# Altium footprint library texas.PCBLIB: 124 footprints (part 2 of 12)
Each footprint in its own frame and in the unit in brackets; x right, y up, seen from the top. Pads: shape width x height; smd on the part's side, far side on the other; paste and mask are expansions set on the pad; w line width, h text height; cw(c..) or ccw(c..) is an arc to the next point about the centre after c.
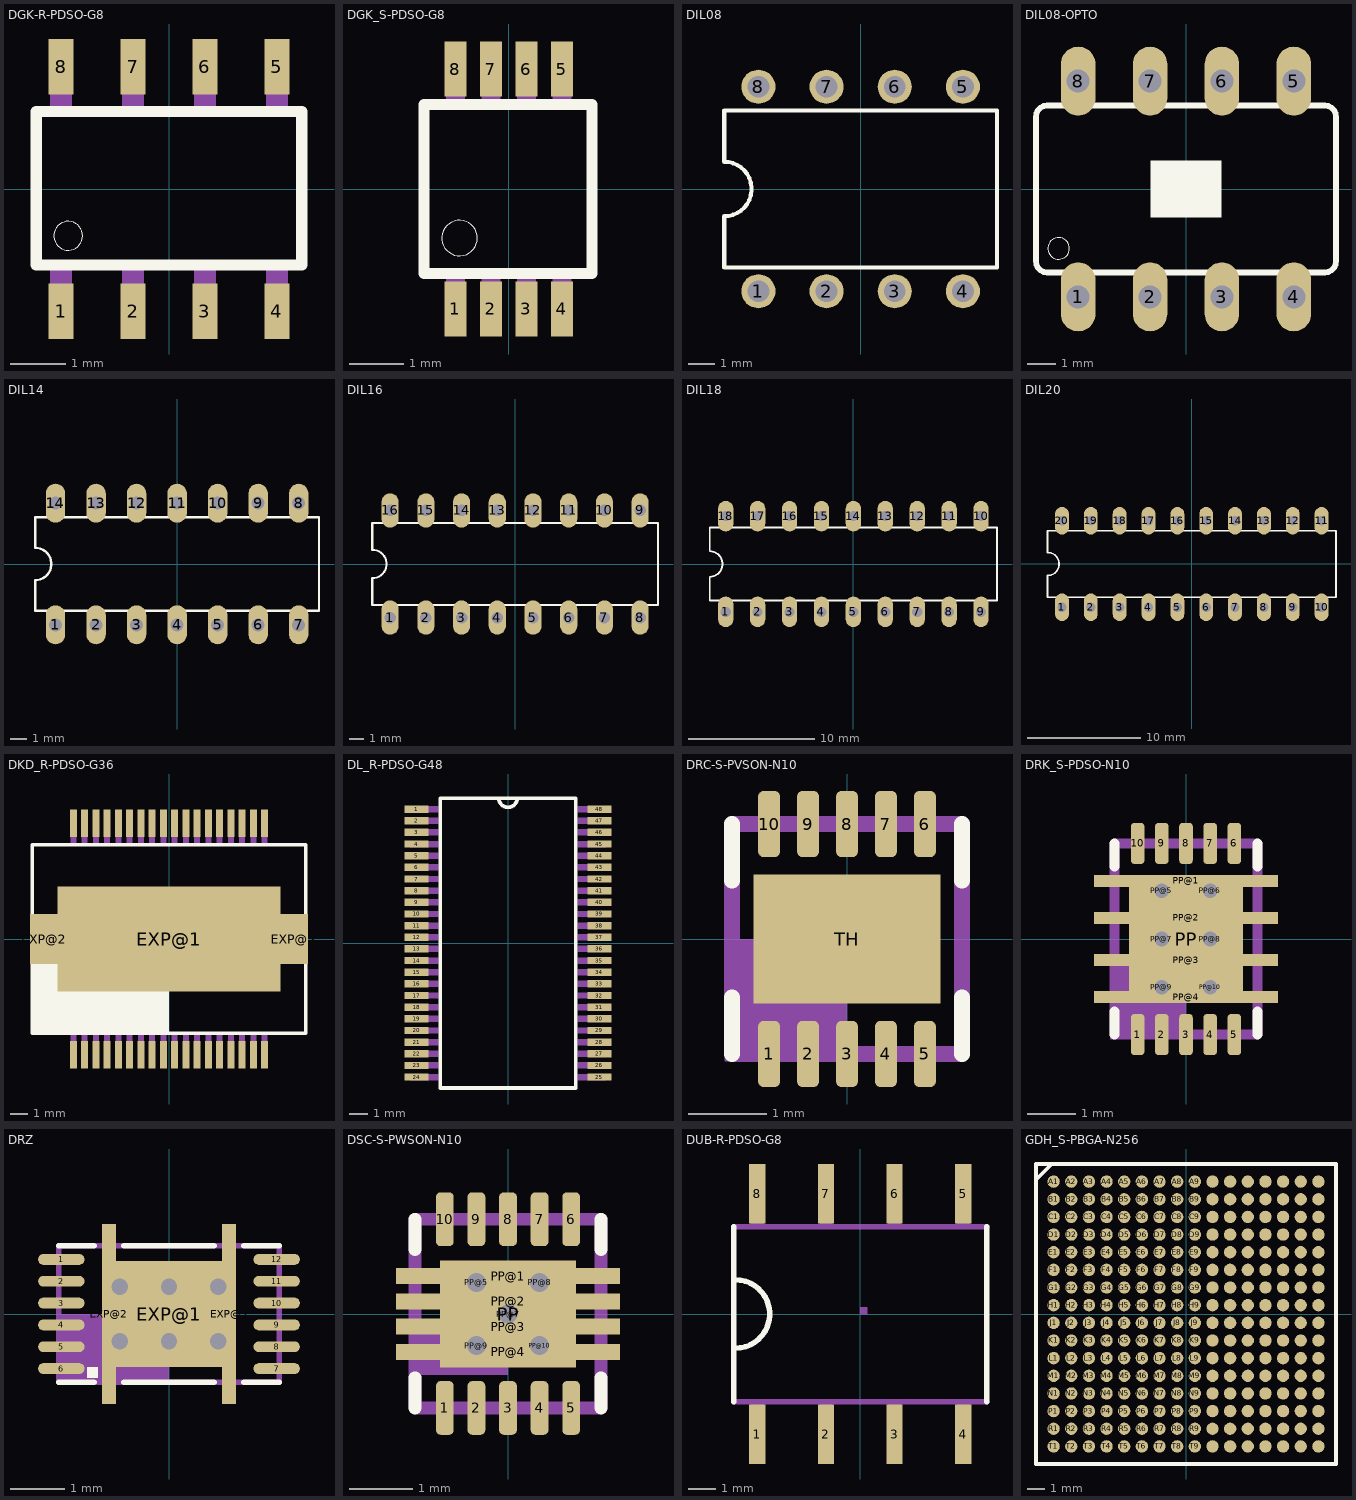
[diagram p1: the footprints below, top view; thin cyan lines are the x and y axes]

## DGK-R-PDSO-G8 [mm]
pads (8):
  rect 0.45x1 smd: 1(-1.95,-2.21) 2(-0.65,-2.21) 3(0.65,-2.21) 4(1.95,-2.21) 5(1.95,2.21) 6(0.65,2.21) 7(-0.65,2.21) 8(-1.95,2.21)
Top Overlay:
  circle w0: c-1.82,-0.845 r0.26
  lines w0.203: 2.4,1.375 2.4,-1.375 -2.4,-1.375 -2.4,1.4 2.4,1.4
Mechanical 16:
  rectangle: -2.15,-2.55 -1.75,-1.43
  rectangle: -0.85,-2.55 -0.45,-1.43
  rectangle: 0.45,-2.55 0.85,-1.43
  rectangle: 1.75,-2.55 2.15,-1.43
  region: 2.15,2.55 1.75,2.55 1.75,1.43 2.15,1.43
  region: 0.85,2.55 0.45,2.55 0.45,1.43 0.85,1.43
  region: -0.45,2.55 -0.85,2.55 -0.85,1.43 -0.45,1.43
  region: -1.75,2.55 -2.15,2.55 -2.15,1.43 -1.75,1.43

## DGK_S-PDSO-G8 [mm]
pads (8):
  rect 0.4x1 smd: 1(-0.975,-2.2) 2(-0.325,-2.2) 3(0.325,-2.2) 4(0.975,-2.2) 5(0.975,2.2) 6(0.325,2.2) 7(-0.325,2.2) 8(-0.975,2.2)
Top Overlay:
  circle w0: c-0.9,-0.9 r0.325
  lines w0.203: -1.55,-1.55 1.525,-1.55 1.525,1.55 -1.55,1.55 -1.55,-1.55
Top Solder:
  rectangle: -1.2,-2.75 -0.75,-1.65
  rectangle: -0.55,-2.75 -0.1,-1.65
  rectangle: 0.1,-2.75 0.55,-1.65
  rectangle: 0.75,-2.75 1.2,-1.65
  region: 1.2,2.75 0.75,2.75 0.75,1.65 1.2,1.65
  region: 0.55,2.75 0.1,2.75 0.1,1.65 0.55,1.65
  region: -0.1,2.75 -0.55,2.75 -0.55,1.65 -0.1,1.65
  region: -0.75,2.75 -1.2,2.75 -1.2,1.65 -0.75,1.65
Mechanical 16:
  rectangle: -1.15,-2.5 -0.8,-1.625
  rectangle: -0.5,-2.5 -0.15,-1.625
  rectangle: 0.15,-2.5 0.5,-1.625
  rectangle: 0.8,-2.5 1.15,-1.625
  region: 1.15,2.5 0.8,2.5 0.8,1.625 1.15,1.625
  region: 0.5,2.5 0.15,2.5 0.15,1.625 0.5,1.625
  region: -0.15,2.5 -0.5,2.5 -0.5,1.625 -0.15,1.625
  region: -0.8,2.5 -1.15,2.5 -1.15,1.625 -0.8,1.625

## DIL08 [mil]
pads (8):
  round 50 hole 32: 1(-150,-150) 2(-50,-150) 3(50,-150) 4(150,-150) 5(150,150) 6(50,150) 7(-50,150) 8(-150,150)
Top Overlay:
  lines w6: -200,-115 200,-115 200,115 -200,115 -200,40 cw(c-200,0) -200,-40 -200,-115

## DIL08-OPTO [mil]
pads (8):
  oval 48x96 hole 32: 1(-150,-150) 2(-50,-150) 3(50,-150) 4(150,-150) 5(150,150) 6(50,150) 7(-50,150) 8(-150,150)
Top Overlay:
  circle w0: c0,-1.97 r0.38
  circle w0: c-177.17,-82.68 r14.96
  rectangle: -49.21,-39.37 49.21,39.37
  lines w8: -208.66,-100.39 ccw(c-192.91,-100.39) -192.91,-116.14 192.91,-116.14 ccw(c192.91,-100.39) 208.66,-100.39 208.66,100.39 ccw(c192.91,100.39) 192.91,116.14 -192.91,116.14 ccw(c-192.91,100.39) -208.66,100.39 -208.66,-100.39

## DIL14 [mil]
pads (14):
  oval 48x96 hole 32: 1(-300,-150) 2(-200,-150) 3(-100,-150) 4(0,-150) 5(100,-150) 6(200,-150) 7(300,-150) 8(300,150) 9(200,150) 10(100,150) 11(0,150) 12(-100,150) 13(-200,150) 14(-300,150)
Top Overlay:
  lines w6: -350,-115 350,-115 350,115 -350,115 -350,40 cw(c-350,0) -350,-40 -350,-115

## DIL16 [mil]
pads (16):
  oval 48x96 hole 32: 1(-350,-150) 2(-250,-150) 3(-150,-150) 4(-50,-150) 5(50,-150) 6(150,-150) 7(250,-150) 8(350,-150) 9(350,150) 10(250,150) 11(150,150) 12(50,150) 13(-50,150) 14(-150,150) 15(-250,150) 16(-350,150)
Top Overlay:
  lines w6: -400,-115 400,-115 400,115 -400,115 -400,40 cw(c-400,0) -400,-40 -400,-115

## DIL18 [mil]
pads (18):
  oval 48x96 hole 32: 1(-400,-150) 2(-300,-150) 3(-200,-150) 4(-100,-150) 5(0,-150) 6(100,-150) 7(200,-150) 8(300,-150) 9(400,-150) 10(400,150) 11(300,150) 12(200,150) 13(100,150) 14(0,150) 15(-100,150) 16(-200,150) 17(-300,150) 18(-400,150)
Top Overlay:
  lines w6: -450,-115 450,-115 450,115 -450,115 -450,40 cw(c-450,0) -450,-40 -450,-115

## DIL20 [mil]
pads (20):
  oval 48x96 hole 32: 1(-450,-150) 2(-350,-150) 3(-250,-150) 4(-150,-150) 5(-50,-150) 6(50,-150) 7(150,-150) 8(250,-150) 9(350,-150) 10(450,-150) 11(450,150) 12(350,150) 13(250,150) 14(150,150) 15(50,150) 16(-50,150) 17(-150,150) 18(-250,150) 19(-350,150) 20(-450,150)
Top Overlay:
  lines w6: -500,-115 500,-115 500,115 -500,115 -500,40 cw(c-500,0) -500,-40 -500,-115

## DKD_R-PDSO-G36 [mm]
pads (39):
  rect 0.4x1.6 smd: 1(-5.525,-6.7) 2(-4.875,-6.7) 3(-4.225,-6.7) 4(-3.575,-6.7) 5(-2.925,-6.7) 6(-2.275,-6.7) 7(-1.625,-6.7) 8(-0.975,-6.7) 9(-0.325,-6.7) 10(0.325,-6.7) 11(0.975,-6.7) 12(1.625,-6.7) 13(2.275,-6.7) 14(2.925,-6.7) 15(3.575,-6.7) 16(4.225,-6.7) 17(4.875,-6.7) 18(5.525,-6.7) 19(5.525,6.7) 20(4.875,6.7) 21(4.225,6.7) 22(3.575,6.7) 23(2.925,6.7) 24(2.275,6.7) 25(1.625,6.7) 26(0.975,6.7) 27(0.325,6.7) 28(-0.325,6.7) 29(-0.975,6.7) 30(-1.625,6.7) 31(-2.275,6.7) 32(-2.925,6.7) 33(-3.575,6.7) 34(-4.225,6.7) 35(-4.875,6.7) 36(-5.525,6.7)
  rect 12.9x6.1 smd: EXP@1(0,0)
  rect 1.6x2.9 smd: EXP@2(-7.225,0) EXP@3(7.225,0)
Top Overlay:
  rectangle: -7.9,-5.425 0,0
  lines w0.203: -7.9,-5.45 7.9,-5.45 7.9,5.45 -7.9,5.45 -7.9,-5.45
Top Solder:
  rectangle: -5.775,-7.55 -5.275,-5.85
  rectangle: -5.125,-7.55 -4.625,-5.85
  rectangle: -4.475,-7.55 -3.975,-5.85
  rectangle: -3.825,-7.55 -3.325,-5.85
  rectangle: -3.175,-7.55 -2.675,-5.85
  rectangle: -2.525,-7.55 -2.025,-5.85
  rectangle: -1.875,-7.55 -1.375,-5.85
  rectangle: -1.225,-7.55 -0.725,-5.85
  rectangle: -0.575,-7.55 -0.075,-5.85
  rectangle: 0.075,-7.55 0.575,-5.85
  rectangle: 0.725,-7.55 1.225,-5.85
  rectangle: 1.375,-7.55 1.875,-5.85
  rectangle: 2.025,-7.55 2.525,-5.85
  rectangle: 2.675,-7.55 3.175,-5.85
  rectangle: 3.325,-7.55 3.825,-5.85
  rectangle: 3.975,-7.55 4.475,-5.85
  rectangle: 4.625,-7.55 5.125,-5.85
  rectangle: 5.275,-7.55 5.775,-5.85
  region: 5.775,7.55 5.275,7.55 5.275,5.85 5.775,5.85
  region: 5.125,7.55 4.625,7.55 4.625,5.85 5.125,5.85
  region: 4.475,7.55 3.975,7.55 3.975,5.85 4.475,5.85
  region: 3.825,7.55 3.325,7.55 3.325,5.85 3.825,5.85
  region: 3.175,7.55 2.675,7.55 2.675,5.85 3.175,5.85
  region: 2.525,7.55 2.025,7.55 2.025,5.85 2.525,5.85
  region: 1.875,7.55 1.375,7.55 1.375,5.85 1.875,5.85
  region: 1.225,7.55 0.725,7.55 0.725,5.85 1.225,5.85
  region: 0.575,7.55 0.075,7.55 0.075,5.85 0.575,5.85
  region: -0.075,7.55 -0.575,7.55 -0.575,5.85 -0.075,5.85
  region: -0.725,7.55 -1.225,7.55 -1.225,5.85 -0.725,5.85
  region: -1.375,7.55 -1.875,7.55 -1.875,5.85 -1.375,5.85
  region: -2.025,7.55 -2.525,7.55 -2.525,5.85 -2.025,5.85
  region: -2.675,7.55 -3.175,7.55 -3.175,5.85 -2.675,5.85
  region: -3.325,7.55 -3.825,7.55 -3.825,5.85 -3.325,5.85
  region: -3.975,7.55 -4.475,7.55 -4.475,5.85 -3.975,5.85
  region: -4.625,7.55 -5.125,7.55 -5.125,5.85 -4.625,5.85
  region: -5.275,7.55 -5.775,7.55 -5.775,5.85 -5.275,5.85
Mechanical 16:
  rectangle: -5.7,-7.25 -5.35,-5.525
  rectangle: -5.05,-7.25 -4.7,-5.525
  rectangle: -4.4,-7.25 -4.05,-5.525
  rectangle: -3.75,-7.25 -3.4,-5.525
  rectangle: -3.1,-7.25 -2.75,-5.525
  rectangle: -2.45,-7.25 -2.1,-5.525
  rectangle: -1.8,-7.25 -1.45,-5.525
  rectangle: -1.15,-7.25 -0.8,-5.525
  rectangle: -0.5,-7.25 -0.15,-5.525
  rectangle: 0.15,-7.25 0.5,-5.525
  rectangle: 0.8,-7.25 1.15,-5.525
  rectangle: 1.45,-7.25 1.8,-5.525
  rectangle: 2.1,-7.25 2.45,-5.525
  rectangle: 2.75,-7.25 3.1,-5.525
  rectangle: 3.4,-7.25 3.75,-5.525
  rectangle: 4.05,-7.25 4.4,-5.525
  rectangle: 4.7,-7.25 5.05,-5.525
  rectangle: 5.35,-7.25 5.7,-5.525
  region: -2.1,7.25 -2.45,7.25 -2.45,5.525 -2.1,5.525
  region: -2.75,7.25 -3.1,7.25 -3.1,5.525 -2.75,5.525
  region: -3.4,7.25 -3.75,7.25 -3.75,5.525 -3.4,5.525
  region: -4.05,7.25 -4.4,7.25 -4.4,5.525 -4.05,5.525
  region: -4.7,7.25 -5.05,7.25 -5.05,5.525 -4.7,5.525
  region: -5.35,7.25 -5.7,7.25 -5.7,5.525 -5.35,5.525
  region: 1.8,7.25 1.45,7.25 1.45,5.525 1.8,5.525
  region: 1.15,7.25 0.8,7.25 0.8,5.525 1.15,5.525
  region: 0.5,7.25 0.15,7.25 0.15,5.525 0.5,5.525
  region: -0.15,7.25 -0.5,7.25 -0.5,5.525 -0.15,5.525
  region: -0.8,7.25 -1.15,7.25 -1.15,5.525 -0.8,5.525
  region: -1.45,7.25 -1.8,7.25 -1.8,5.525 -1.45,5.525
  region: 5.7,7.25 5.35,7.25 5.35,5.525 5.7,5.525
  region: 5.05,7.25 4.7,7.25 4.7,5.525 5.05,5.525
  region: 4.4,7.25 4.05,7.25 4.05,5.525 4.4,5.525
  region: 3.75,7.25 3.4,7.25 3.4,5.525 3.75,5.525
  region: 3.1,7.25 2.75,7.25 2.75,5.525 3.1,5.525
  region: 2.45,7.25 2.1,7.25 2.1,5.525 2.45,5.525

## DL_R-PDSO-G48 [mil]
pads (48):
  rect 51.18x15.75 smd: 1(-196.06,287.5) 2(-196.06,262.5) 3(-196.06,237.5) 4(-196.06,212.5) 5(-196.06,187.5) 6(-196.06,162.5) 7(-196.06,137.5) 8(-196.06,112.5) 9(-196.06,87.5) 10(-196.06,62.5) 11(-196.06,37.5) 12(-196.06,12.5) 13(-196.06,-12.5) 14(-196.06,-37.5) 15(-196.06,-62.5) 16(-196.06,-87.5) 17(-196.06,-112.5) 18(-196.06,-137.5) 19(-196.06,-162.5) 20(-196.06,-187.5) 21(-196.06,-212.5) 22(-196.06,-237.5) 23(-196.06,-262.5) 24(-196.06,-287.5) 25(196.06,-287.5) 26(196.06,-262.5) 27(196.06,-237.5) 28(196.06,-212.5) 29(196.06,-187.5) 30(196.06,-162.5) 31(196.06,-137.5) 32(196.06,-112.5) 33(196.06,-87.5) 34(196.06,-62.5) 35(196.06,-37.5) 36(196.06,-12.5) 37(196.06,12.5) 38(196.06,37.5) 39(196.06,62.5) 40(196.06,87.5) 41(196.06,112.5) 42(196.06,137.5) 43(196.06,162.5) 44(196.06,187.5) 45(196.06,212.5) 46(196.06,237.5) 47(196.06,262.5) 48(196.06,287.5)
Top Overlay:
  lines w8: -19.69,310.96 ccw(c0,310.96) 19.69,310.96 ; -145.61,-310.96 145.61,-310.96 145.61,310.96 -145.61,310.96 -145.61,-310.96
Mechanical 16:
  rectangle: -209.84,280.61 -149.61,294.39
  rectangle: -209.84,255.61 -149.61,269.39
  rectangle: -209.84,230.61 -149.61,244.39
  rectangle: -209.84,205.61 -149.61,219.39
  rectangle: -209.84,180.61 -149.61,194.39
  rectangle: -209.84,155.61 -149.61,169.39
  rectangle: -209.84,130.61 -149.61,144.39
  rectangle: -209.84,105.61 -149.61,119.39
  rectangle: -209.84,80.61 -149.61,94.39
  rectangle: -209.84,55.61 -149.61,69.39
  rectangle: -209.84,30.61 -149.61,44.39
  rectangle: -209.84,5.61 -149.61,19.39
  rectangle: -209.84,-19.39 -149.61,-5.61
  rectangle: -209.84,-44.39 -149.61,-30.61
  rectangle: -209.84,-69.39 -149.61,-55.61
  rectangle: -209.84,-94.39 -149.61,-80.61
  rectangle: -209.84,-119.39 -149.61,-105.61
  rectangle: -209.84,-144.39 -149.61,-130.61
  rectangle: -209.84,-169.39 -149.61,-155.61
  rectangle: -209.84,-194.39 -149.61,-180.61
  rectangle: -209.84,-219.39 -149.61,-205.61
  rectangle: -209.84,-244.39 -149.61,-230.61
  rectangle: -209.84,-269.39 -149.61,-255.61
  rectangle: -209.84,-294.39 -149.61,-280.61
  rectangle: 149.61,-294.39 209.84,-280.61
  rectangle: 149.61,-269.39 209.84,-255.61
  rectangle: 149.61,-244.39 209.84,-230.61
  rectangle: 149.61,-219.39 209.84,-205.61
  rectangle: 149.61,-194.39 209.84,-180.61
  rectangle: 149.61,-169.39 209.84,-155.61
  rectangle: 149.61,-144.39 209.84,-130.61
  rectangle: 149.61,-119.39 209.84,-105.61
  rectangle: 149.61,-94.39 209.84,-80.61
  rectangle: 149.61,-69.39 209.84,-55.61
  rectangle: 149.61,-44.39 209.84,-30.61
  rectangle: 149.61,-19.39 209.84,-5.61
  rectangle: 149.61,5.61 209.84,19.39
  rectangle: 149.61,30.61 209.84,44.39
  rectangle: 149.61,55.61 209.84,69.39
  rectangle: 149.61,80.61 209.84,94.39
  rectangle: 149.61,105.61 209.84,119.39
  rectangle: 149.61,130.61 209.84,144.39
  rectangle: 149.61,155.61 209.84,169.39
  rectangle: 149.61,180.61 209.84,194.39
  rectangle: 149.61,205.61 209.84,219.39
  rectangle: 149.61,230.61 209.84,244.39
  rectangle: 149.61,255.61 209.84,269.39
  rectangle: 149.61,280.61 209.84,294.39

## DRC-S-PVSON-N10 [mm]
pads (11):
  rrect50% 0.28x0.85 smd: 1(-1,-1.475) 2(-0.5,-1.475) 3(0,-1.475) 4(0.5,-1.475) 5(1,-1.475) 6(1,1.475) 7(0.5,1.475) 8(0,1.475) 9(-0.5,1.475) 10(-1,1.475)
  rect 2.4x1.65 smd: TH(0,0)
Top Layer:
  region: 0,0 0.254,0 0.254,0.254 0,0.254
Top Overlay:
  lines w0.203: -1.475,-1.475 -1.475,-0.748 ; -1.475,0.748 -1.475,1.475 ; 1.475,-1.475 1.475,-0.748 ; 1.475,0.748 1.475,1.475
Top Paste:
  circle w0: c-1,-1.165 r0.115
  circle w0: c-0.5,-1.165 r0.115
  circle w0: c0,-1.165 r0.115
  circle w0: c0.5,-1.165 r0.115
  circle w0: c1,-1.165 r0.115
  circle w0: c1,1.165 r0.115
  circle w0: c0.5,1.165 r0.115
  circle w0: c0,1.165 r0.115
  circle w0: c-0.5,1.165 r0.115
  circle w0: c-1,1.165 r0.115
  rectangle: -1.9,0.15 -1.325,0.4
  rectangle: -1.9,-0.4 -1.325,-0.15
  rectangle: -1.175,0.15 -0.15,0.8
  rectangle: -1.175,-0.8 -0.15,-0.15
  region: 1.175,-0.15 0.15,-0.15 0.15,-0.8 1.175,-0.8
  region: 1.175,0.8 0.15,0.8 0.15,0.15 1.175,0.15
  region: -0.885,-1.85 -0.885,-1.165 -1.115,-1.165 -1.115,-1.85
  region: -0.385,-1.85 -0.385,-1.165 -0.615,-1.165 -0.615,-1.85
  region: 0.115,-1.85 0.115,-1.165 -0.115,-1.165 -0.115,-1.85
  region: 0.615,-1.85 0.615,-1.165 0.385,-1.165 0.385,-1.85
  region: 1.115,-1.85 1.115,-1.165 0.885,-1.165 0.885,-1.85
  region: 0.885,1.85 0.885,1.165 1.115,1.165 1.115,1.85
  region: 0.385,1.85 0.385,1.165 0.615,1.165 0.615,1.85
  region: -0.115,1.85 -0.115,1.165 0.115,1.165 0.115,1.85
  region: -0.615,1.85 -0.615,1.165 -0.385,1.165 -0.385,1.85
  region: -1.115,1.85 -1.115,1.165 -0.885,1.165 -0.885,1.85
  region: 1.9,-0.15 1.325,-0.15 1.325,-0.4 1.9,-0.4
  region: 1.9,0.4 1.325,0.4 1.325,0.15 1.9,0.15
Top Solder:
  circle w0: c-1,-1.165 r0.175
  circle w0: c-0.5,-1.165 r0.175
  circle w0: c0,-1.165 r0.175
  circle w0: c0.5,-1.165 r0.175
  circle w0: c1,-1.165 r0.175
  circle w0: c1,1.165 r0.175
  circle w0: c0.5,1.165 r0.175
  circle w0: c0,1.165 r0.175
  circle w0: c-0.5,1.165 r0.175
  circle w0: c-1,1.165 r0.175
  rectangle: -1.925,0.125 -1.325,0.425
  rectangle: -1.925,-0.425 -1.325,-0.125
  rectangle: -1.225,-0.85 1.225,0.85
  rectangle: -1.175,-1.925 -0.825,-1.165
  rectangle: -0.675,-1.925 -0.325,-1.165
  rectangle: -0.175,-1.925 0.175,-1.165
  rectangle: 0.325,-1.925 0.675,-1.165
  rectangle: 0.825,-1.925 1.175,-1.165
  region: 1.175,1.925 0.825,1.925 0.825,1.165 1.175,1.165
  region: 0.675,1.925 0.325,1.925 0.325,1.165 0.675,1.165
  region: 0.175,1.925 -0.175,1.925 -0.175,1.165 0.175,1.165
  region: -0.325,1.925 -0.675,1.925 -0.675,1.165 -0.325,1.165
  region: -0.825,1.925 -1.175,1.925 -1.175,1.165 -0.825,1.165
  region: 1.925,-0.125 1.325,-0.125 1.325,-0.425 1.925,-0.425
  region: 1.925,0.425 1.325,0.425 1.325,0.125 1.925,0.125
Mechanical 16:
  rectangle: -1.575,-1.575 0,0
  lines w0.203: -1.475,-1.475 1.475,-1.475 1.475,1.475 -1.475,1.475 -1.475,-1.475

## DRK_S-PDSO-N10 [mm]
pads (21):
  rrect50% 0.28x0.85 smd: 1(-1,-1.975) 2(-0.5,-1.975) 3(0,-1.975) 4(0.5,-1.975) 5(1,-1.975) 6(1,1.975) 7(0.5,1.975) 8(0,1.975) 9(-0.5,1.975) 10(-1,1.975)
  rect 2.35x2.65 smd: PP(0,0)
  rect 3.8x0.25 smd: PP@1(0,1.2) PP@2(0,0.435) PP@3(0,-0.435) PP@4(0,-1.2)
  round 0.5 hole 0.3: PP@5(-0.5,1) PP@6(0.5,1) PP@7(-0.5,0) PP@8(0.5,0) PP@9(-0.5,-1) PP@10(0.5,-1)
Top Overlay:
  lines w0.203: -1.475,-1.975 -1.475,-1.498 ; -1.475,1.498 -1.475,1.975 ; 1.475,-1.975 1.475,-1.498 ; 1.475,1.498 1.475,1.975
Top Paste:
  circle w0: c-1,-1.665 r0.115
  circle w0: c-0.5,-1.665 r0.115
  circle w0: c0,-1.665 r0.115
  circle w0: c0.5,-1.665 r0.115
  circle w0: c1,-1.665 r0.115
  circle w0: c1,1.665 r0.115
  circle w0: c0.5,1.665 r0.115
  circle w0: c0,1.665 r0.115
  circle w0: c-0.5,1.665 r0.115
  circle w0: c-1,1.665 r0.115
  rectangle: -1.9,1.075 -1.325,1.325
  rectangle: -1.9,0.325 -1.325,0.55
  rectangle: -1,0.1 -0.1,1.3
  region: -0.885,-2.35 -0.885,-1.665 -1.115,-1.665 -1.115,-2.35
  region: -0.385,-2.35 -0.385,-1.665 -0.615,-1.665 -0.615,-2.35
  region: 0.115,-2.35 0.115,-1.665 -0.115,-1.665 -0.115,-2.35
  region: 0.615,-2.35 0.615,-1.665 0.385,-1.665 0.385,-2.35
  region: 1.115,-2.35 1.115,-1.665 0.885,-1.665 0.885,-2.35
  region: 0.885,2.35 0.885,1.665 1.115,1.665 1.115,2.35
  region: 0.385,2.35 0.385,1.665 0.615,1.665 0.615,2.35
  region: -0.115,2.35 -0.115,1.665 0.115,1.665 0.115,2.35
  region: -0.615,2.35 -0.615,1.665 -0.385,1.665 -0.385,2.35
  region: -1.115,2.35 -1.115,1.665 -0.885,1.665 -0.885,2.35
  rectangle: -1.9,-1.325 -1.325,-1.075
  rectangle: -1.9,-0.55 -1.325,-0.325
  region: 1.9,-1.075 1.325,-1.075 1.325,-1.325 1.9,-1.325
  region: 1.9,-0.325 1.325,-0.325 1.325,-0.55 1.9,-0.55
  region: 1.9,1.325 1.325,1.325 1.325,1.075 1.9,1.075
  region: 1.9,0.55 1.325,0.55 1.325,0.325 1.9,0.325
  region: 1,-0.1 0.1,-0.1 0.1,-1.3 1,-1.3
  rectangle: 0.1,0.1 1,1.3
  region: -0.1,-0.1 -1,-0.1 -1,-1.3 -0.1,-1.3
Top Solder:
  circle w0: c-1,-1.665 r0.175
  circle w0: c-0.5,-1.665 r0.175
  circle w0: c0,-1.665 r0.175
  circle w0: c0.5,-1.665 r0.175
  circle w0: c1,-1.665 r0.175
  circle w0: c1,1.665 r0.175
  circle w0: c0.5,1.665 r0.175
  circle w0: c0,1.665 r0.175
  circle w0: c-0.5,1.665 r0.175
  circle w0: c-1,1.665 r0.175
  rectangle: -1.925,1.05 -1.175,1.35
  rectangle: -1.925,0.275 -1.175,0.6
  rectangle: -1.225,-1.375 1.225,1.375
  rectangle: -1.175,-2.425 -0.825,-1.665
  rectangle: -0.675,-2.425 -0.325,-1.665
  rectangle: -0.175,-2.425 0.175,-1.665
  rectangle: 0.325,-2.425 0.675,-1.665
  rectangle: 0.825,-2.425 1.175,-1.665
  region: 1.175,2.425 0.825,2.425 0.825,1.665 1.175,1.665
  region: 0.675,2.425 0.325,2.425 0.325,1.665 0.675,1.665
  region: 0.175,2.425 -0.175,2.425 -0.175,1.665 0.175,1.665
  region: -0.325,2.425 -0.675,2.425 -0.675,1.665 -0.325,1.665
  region: -0.825,2.425 -1.175,2.425 -1.175,1.665 -0.825,1.665
  rectangle: -1.925,-1.35 -1.175,-1.05
  rectangle: -1.925,-0.6 -1.175,-0.275
  region: 1.925,-1.05 1.175,-1.05 1.175,-1.35 1.925,-1.35
  region: 1.925,-0.275 1.175,-0.275 1.175,-0.6 1.925,-0.6
  region: 1.925,1.35 1.175,1.35 1.175,1.05 1.925,1.05
  region: 1.925,0.6 1.175,0.6 1.175,0.275 1.925,0.275
Mechanical 16:
  rectangle: -1.575,-2.075 0,-0.5
  lines w0.203: -1.475,-1.975 1.475,-1.975 1.475,1.975 -1.475,1.975 -1.475,-1.975

## DRZ [mil]
pads (21):
  rrect100% 33.46x7.87 smd: 1(-77.76,39.37) 2(-77.76,23.62) 3(-77.76,7.87) 4(-77.76,-7.87) 5(-77.76,-23.62) 6(-77.76,-39.37) 7(77.76,-39.37) 8(77.76,-23.62) 9(77.76,-7.87) 10(77.76,7.87) 11(77.76,23.62) 12(77.76,39.37)
  rect 96.46x76.77 smd: EXP@1(0,0)
  rect 9.84x129.92 smd: EXP@2(-43.31,0) EXP@3(43.31,0)
  round 16 hole 11.81: EXP@4(-35.43,19.69) EXP@5(0,19.69) EXP@6(35.43,19.69) EXP@7(-35.43,-19.69) EXP@8(0,-19.69) EXP@9(35.43,-19.69)
Top Overlay:
  rectangle: -59.06,-46.26 -51.18,-38.39
  lines w4: -79.72,-49.21 -54.13,-49.21 ; -79.72,49.21 -54.13,49.21 ; -32.48,-49.21 32.48,-49.21 ; -32.48,49.21 32.48,49.21 ; 54.13,-49.21 79.72,-49.21 ; 54.13,49.21 79.72,49.21
Top Paste:
  circle w0: c-64.96,39.37 r2.95
  circle w0: c-64.96,23.62 r2.95
  circle w0: c-64.96,7.87 r2.95
  circle w0: c-64.96,-7.87 r2.95
  circle w0: c-64.96,-23.62 r2.95
  circle w0: c-64.96,-39.37 r2.95
  circle w0: c64.96,-39.37 r2.95
  circle w0: c64.96,-23.62 r2.95
  circle w0: c64.96,-7.87 r2.95
  circle w0: c64.96,7.87 r2.95
  circle w0: c64.96,23.62 r2.95
  circle w0: c64.96,39.37 r2.95
  rectangle: -91.54,36.42 -64.96,42.32
  rectangle: -91.54,20.67 -64.96,26.57
  rectangle: -91.54,4.92 -64.96,10.83
  rectangle: -91.54,-10.83 -64.96,-4.92
  rectangle: -91.54,-26.57 -64.96,-20.67
  rectangle: -91.54,-42.32 -64.96,-36.42
  region: 91.54,-36.42 64.96,-36.42 64.96,-42.32 91.54,-42.32
  region: 91.54,-20.67 64.96,-20.67 64.96,-26.57 91.54,-26.57
  region: 91.54,-4.92 64.96,-4.92 64.96,-10.83 91.54,-10.83
  region: 91.54,10.83 64.96,10.83 64.96,4.92 91.54,4.92
  region: 91.54,26.57 64.96,26.57 64.96,20.67 91.54,20.67
  region: 91.54,42.32 64.96,42.32 64.96,36.42 91.54,36.42
  rectangle: -43.31,3.94 -3.94,35.43
  rectangle: 3.94,3.94 43.31,35.43
  rectangle: -43.31,-35.43 -3.94,-3.94
  rectangle: 3.94,-35.43 43.31,-3.94
  rectangle: -48.23,43.31 -38.39,63.98
  rectangle: 38.39,43.31 48.23,63.98
  rectangle: -48.23,-63.98 -38.39,-43.31
  rectangle: 38.39,-63.98 48.23,-43.31
Top Solder:
  circle w0: c-64.96,39.37 r4.92
  circle w0: c-64.96,23.62 r4.92
  circle w0: c-64.96,7.87 r4.92
  circle w0: c-64.96,-7.87 r4.92
  circle w0: c-64.96,-23.62 r4.92
  circle w0: c-64.96,-39.37 r4.92
  circle w0: c64.96,-39.37 r4.92
  circle w0: c64.96,-23.62 r4.92
  circle w0: c64.96,-7.87 r4.92
  circle w0: c64.96,7.87 r4.92
  circle w0: c64.96,23.62 r4.92
  circle w0: c64.96,39.37 r4.92
  rectangle: -92.52,34.45 -64.96,44.29
  rectangle: -92.52,18.7 -64.96,28.54
  rectangle: -92.52,2.95 -64.96,12.8
  rectangle: -92.52,-12.8 -64.96,-2.95
  rectangle: -92.52,-28.54 -64.96,-18.7
  rectangle: -92.52,-44.29 -64.96,-34.45
  region: 92.52,-34.45 64.96,-34.45 64.96,-44.29 92.52,-44.29
  region: 92.52,-18.7 64.96,-18.7 64.96,-28.54 92.52,-28.54
  region: 92.52,-2.95 64.96,-2.95 64.96,-12.8 92.52,-12.8
  region: 92.52,12.8 64.96,12.8 64.96,2.95 92.52,2.95
  region: 92.52,28.54 64.96,28.54 64.96,18.7 92.52,18.7
  region: 92.52,44.29 64.96,44.29 64.96,34.45 92.52,34.45
  rectangle: -49.21,-65.94 -37.4,65.94
  rectangle: 37.4,-65.94 49.21,65.94
  rectangle: -38.39,-39.37 38.39,39.37
Mechanical 16:
  rectangle: -78.74,-47.24 0,0
  lines w4: -79.72,-49.21 -79.72,49.21 79.72,49.21 79.72,-49.21 -79.72,-49.21

## DSC-S-PWSON-N10 [mm]
pads (20):
  rrect50% 0.28x0.85 smd: 1(-1,-1.487) 2(-0.5,-1.487) 3(0,-1.487) 4(0.5,-1.487) 5(1,-1.487) 6(1,1.5) 7(0.5,1.5) 8(0,1.5) 9(-0.5,1.5) 10(-1,1.5)
  rect 2.15x1.7 smd: PP(0,0)
  rect 3.55x0.25 smd: PP@1(0,0.6) PP@2(0,0.2) PP@3(0,-0.2) PP@4(0,-0.6)
  round 0.4 hole 0.3: PP@5(-0.5,0.5) PP@7(0,0) PP@8(0.5,0.5) PP@9(-0.5,-0.5) PP@10(0.5,-0.5)
Top Overlay:
  lines w0.203: -1.475,-1.487 -1.475,-1.01 ; -1.475,1.023 -1.475,1.5 ; 1.475,-1.487 1.475,-1.01 ; 1.475,1.023 1.475,1.5
Top Paste:
  circle w0: c-1,-1.178 r0.115
  circle w0: c-0.5,-1.178 r0.115
  circle w0: c0,-1.178 r0.115
  circle w0: c0.5,-1.178 r0.115
  circle w0: c1,-1.178 r0.115
  circle w0: c1,1.19 r0.115
  circle w0: c0.5,1.19 r0.115
  circle w0: c0,1.19 r0.115
  circle w0: c-0.5,1.19 r0.115
  circle w0: c-1,1.19 r0.115
  rectangle: -1.775,0.475 -1.2,0.725
  rectangle: -1.775,0.09 -1.2,0.315
  rectangle: -1,0.1 -0.1,0.775
  region: -0.885,-1.862 -0.885,-1.178 -1.115,-1.178 -1.115,-1.862
  region: -0.385,-1.863 -0.385,-1.178 -0.615,-1.178 -0.615,-1.863
  region: 0.115,-1.862 0.115,-1.178 -0.115,-1.178 -0.115,-1.862
  region: 0.615,-1.863 0.615,-1.178 0.385,-1.178 0.385,-1.863
  region: 1.115,-1.862 1.115,-1.178 0.885,-1.178 0.885,-1.862
  region: 0.885,1.875 0.885,1.19 1.115,1.19 1.115,1.875
  region: 0.385,1.875 0.385,1.19 0.615,1.19 0.615,1.875
  region: -0.115,1.875 -0.115,1.19 0.115,1.19 0.115,1.875
  region: -0.615,1.875 -0.615,1.19 -0.385,1.19 -0.385,1.875
  region: -1.115,1.875 -1.115,1.19 -0.885,1.19 -0.885,1.875
  rectangle: -1.775,-0.725 -1.2,-0.475
  rectangle: -1.775,-0.315 -1.2,-0.09
  region: 1.775,-0.475 1.2,-0.475 1.2,-0.725 1.775,-0.725
  region: 1.775,-0.09 1.2,-0.09 1.2,-0.315 1.775,-0.315
  region: 1.775,0.725 1.2,0.725 1.2,0.475 1.775,0.475
  region: 1.775,0.315 1.2,0.315 1.2,0.09 1.775,0.09
  region: 1,-0.1 0.1,-0.1 0.1,-0.775 1,-0.775
  rectangle: 0.1,0.1 1,0.775
  region: -0.1,-0.1 -1,-0.1 -1,-0.775 -0.1,-0.775
Top Solder:
  circle w0: c-1,-1.178 r0.175
  circle w0: c-0.5,-1.178 r0.175
  circle w0: c0,-1.178 r0.175
  circle w0: c0.5,-1.178 r0.175
  circle w0: c1,-1.178 r0.175
  circle w0: c1,1.19 r0.175
  circle w0: c0.5,1.19 r0.175
  circle w0: c0,1.19 r0.175
  circle w0: c-0.5,1.19 r0.175
  circle w0: c-1,1.19 r0.175
  rectangle: -1.8,0.45 -1.05,0.75
  rectangle: -1.8,0.04 -1.05,0.365
  rectangle: -1.2,-0.9 1.225,0.9
  rectangle: -1.175,-1.938 -0.825,-1.178
  rectangle: -0.675,-1.938 -0.325,-1.178
  rectangle: -0.175,-1.938 0.175,-1.178
  rectangle: 0.325,-1.938 0.675,-1.178
  rectangle: 0.825,-1.938 1.175,-1.178
  region: 1.175,1.95 0.825,1.95 0.825,1.19 1.175,1.19
  region: 0.675,1.95 0.325,1.95 0.325,1.19 0.675,1.19
  region: 0.175,1.95 -0.175,1.95 -0.175,1.19 0.175,1.19
  region: -0.325,1.95 -0.675,1.95 -0.675,1.19 -0.325,1.19
  region: -0.825,1.95 -1.175,1.95 -1.175,1.19 -0.825,1.19
  rectangle: -1.8,-0.75 -1.05,-0.45
  rectangle: -1.8,-0.365 -1.05,-0.04
  region: 1.8,-0.45 1.05,-0.45 1.05,-0.75 1.8,-0.75
  region: 1.8,-0.04 1.05,-0.04 1.05,-0.365 1.8,-0.365
  region: 1.8,0.75 1.05,0.75 1.05,0.45 1.8,0.45
  region: 1.8,0.365 1.05,0.365 1.05,0.04 1.8,0.04
Mechanical 16:
  rectangle: -1.575,-0.962 0,-0.1
  lines w0.203: -1.475,-1.487 1.475,-1.487 1.475,1.5 -1.475,1.5 -1.475,-1.487

## DUB-R-PDSO-G8 [mm]
pads (8):
  rect 0.6x2.2 smd: 1(-3.81,-4.445) 2(-1.27,-4.445) 3(1.27,-4.445) 4(3.81,-4.445) 5(3.81,4.445) 6(1.27,4.445) 7(-1.27,4.445) 8(-3.81,4.445)
Top Overlay:
  lines w0.203: -4.675,-3.25 -4.675,3.225 ; -4.62,-1.27 ccw(c-4.62,0) -4.62,1.27 ; 4.675,-3.25 4.675,3.225
Mechanical 16:
  rectangle: -4.055,-5.35 -3.565,-3.175
  rectangle: -1.515,-5.35 -1.025,-3.175
  rectangle: 1.025,-5.35 1.515,-3.175
  rectangle: 3.565,-5.35 4.055,-3.175
  rectangle: 3.565,3.175 4.055,5.35
  rectangle: 1.025,3.175 1.515,5.35
  rectangle: -1.515,3.175 -1.025,5.35
  rectangle: -4.055,3.175 -3.565,5.35
  region: 0,0 0.254,0 0.254,0.254 0,0.254
  region: 0,0 0.254,0 0.254,0.254 0,0.254
  region: 0,0 0.254,0 0.254,0.254 0,0.254
  region: 0,0 0.254,0 0.254,0.254 0,0.254
  region: 0,0 0.254,0 0.254,0.254 0,0.254
  region: 0,0 0.254,0 0.254,0.254 0,0.254
  region: 0,0 0.254,0 0.254,0.254 0,0.254
  region: 0,0 0.254,0 0.254,0.254 0,0.254
  region: 0,0 0.254,0 0.254,0.254 0,0.254
  region: 0,0 0.254,0 0.254,0.254 0,0.254
  region: 0,0 0.254,0 0.254,0.254 0,0.254
  region: 0,0 0.254,0 0.254,0.254 0,0.254
  lines w0.203: -4.675,-3.25 4.675,-3.25 ; -4.675,3.225 4.675,3.225

## GDH_S-PBGA-N256 [mm]
pads (256):
  rrect100% 0.7x0.7 smd: A1(-7.5,7.5) A2(-6.5,7.5) A3(-5.5,7.5) A4(-4.5,7.5) A5(-3.5,7.5) A6(-2.5,7.5) A7(-1.5,7.5) A8(-0.5,7.5) A9(0.5,7.5) A10(1.5,7.5) A11(2.5,7.5) A12(3.5,7.5) A13(4.5,7.5) A14(5.5,7.5) A15(6.5,7.5) A16(7.5,7.5) B1(-7.5,6.5) B2(-6.5,6.5) B3(-5.5,6.5) B4(-4.5,6.5) B5(-3.5,6.5) B6(-2.5,6.5) B7(-1.5,6.5) B8(-0.5,6.5) B9(0.5,6.5) B10(1.5,6.5) B11(2.5,6.5) B12(3.5,6.5) B13(4.5,6.5) B14(5.5,6.5) B15(6.5,6.5) B16(7.5,6.5) C1(-7.5,5.5) C2(-6.5,5.5) C3(-5.5,5.5) C4(-4.5,5.5) C5(-3.5,5.5) C6(-2.5,5.5) C7(-1.5,5.5) C8(-0.5,5.5) C9(0.5,5.5) C10(1.5,5.5) C11(2.5,5.5) C12(3.5,5.5) C13(4.5,5.5) C14(5.5,5.5) C15(6.5,5.5) C16(7.5,5.5) D1(-7.5,4.5) D2(-6.5,4.5) D3(-5.5,4.5) D4(-4.5,4.5) D5(-3.5,4.5) D6(-2.5,4.5) D7(-1.5,4.5) D8(-0.5,4.5) D9(0.5,4.5) D10(1.5,4.5) D11(2.5,4.5) D12(3.5,4.5) D13(4.5,4.5) D14(5.5,4.5) D15(6.5,4.5) D16(7.5,4.5) E1(-7.5,3.5) E2(-6.5,3.5) E3(-5.5,3.5) E4(-4.5,3.5) E5(-3.5,3.5) E6(-2.5,3.5) E7(-1.5,3.5) E8(-0.5,3.5) E9(0.5,3.5) E10(1.5,3.5) E11(2.5,3.5) E12(3.5,3.5) E13(4.5,3.5) E14(5.5,3.5) E15(6.5,3.5) E16(7.5,3.5) F1(-7.5,2.5) F2(-6.5,2.5) F3(-5.5,2.5) F4(-4.5,2.5) F5(-3.5,2.5) F6(-2.5,2.5) F7(-1.5,2.5) F8(-0.5,2.5) F9(0.5,2.5) F10(1.5,2.5) F11(2.5,2.5) F12(3.5,2.5) F13(4.5,2.5) F14(5.5,2.5) F15(6.5,2.5) F16(7.5,2.5) G1(-7.5,1.5) G2(-6.5,1.5) G3(-5.5,1.5) G4(-4.5,1.5) G5(-3.5,1.5) G6(-2.5,1.5) G7(-1.5,1.5) G8(-0.5,1.5) G9(0.5,1.5) G10(1.5,1.5) G11(2.5,1.5) G12(3.5,1.5) G13(4.5,1.5) G14(5.5,1.5) G15(6.5,1.5) G16(7.5,1.5) H1(-7.5,0.5) H2(-6.5,0.5) H3(-5.5,0.5) H4(-4.5,0.5) H5(-3.5,0.5) H6(-2.5,0.5) H7(-1.5,0.5) H8(-0.5,0.5) H9(0.5,0.5) H10(1.5,0.5) H11(2.5,0.5) H12(3.5,0.5) H13(4.5,0.5) H14(5.5,0.5) H15(6.5,0.5) H16(7.5,0.5) J1(-7.5,-0.5) J2(-6.5,-0.5) J3(-5.5,-0.5) J4(-4.5,-0.5) J5(-3.5,-0.5) J6(-2.5,-0.5) J7(-1.5,-0.5) J8(-0.5,-0.5) J9(0.5,-0.5) J10(1.5,-0.5) J11(2.5,-0.5) J12(3.5,-0.5) J13(4.5,-0.5) J14(5.5,-0.5) J15(6.5,-0.5) J16(7.5,-0.5) K1(-7.5,-1.5) K2(-6.5,-1.5) K3(-5.5,-1.5) K4(-4.5,-1.5) K5(-3.5,-1.5) K6(-2.5,-1.5) K7(-1.5,-1.5) K8(-0.5,-1.5) K9(0.5,-1.5) K10(1.5,-1.5) K11(2.5,-1.5) K12(3.5,-1.5) K13(4.5,-1.5) K14(5.5,-1.5) K15(6.5,-1.5) K16(7.5,-1.5) L1(-7.5,-2.5) L2(-6.5,-2.5) L3(-5.5,-2.5) L4(-4.5,-2.5) L5(-3.5,-2.5) L6(-2.5,-2.5) L7(-1.5,-2.5) L8(-0.5,-2.5) L9(0.5,-2.5) L10(1.5,-2.5) L11(2.5,-2.5) L12(3.5,-2.5) L13(4.5,-2.5) L14(5.5,-2.5) L15(6.5,-2.5) L16(7.5,-2.5) M1(-7.5,-3.5) M2(-6.5,-3.5) M3(-5.5,-3.5) M4(-4.5,-3.5) M5(-3.5,-3.5) M6(-2.5,-3.5) M7(-1.5,-3.5) M8(-0.5,-3.5) M9(0.5,-3.5) M10(1.5,-3.5) M11(2.5,-3.5) M12(3.5,-3.5) M13(4.5,-3.5) M14(5.5,-3.5) M15(6.5,-3.5) M16(7.5,-3.5) N1(-7.5,-4.5) N2(-6.5,-4.5) N3(-5.5,-4.5) N4(-4.5,-4.5) N5(-3.5,-4.5) N6(-2.5,-4.5) N7(-1.5,-4.5) N8(-0.5,-4.5) N9(0.5,-4.5) N10(1.5,-4.5) N11(2.5,-4.5) N12(3.5,-4.5) N13(4.5,-4.5) N14(5.5,-4.5) N15(6.5,-4.5) N16(7.5,-4.5) P1(-7.5,-5.5) P2(-6.5,-5.5) P3(-5.5,-5.5) P4(-4.5,-5.5) P5(-3.5,-5.5) P6(-2.5,-5.5) P7(-1.5,-5.5) P8(-0.5,-5.5) P9(0.5,-5.5) P10(1.5,-5.5) P11(2.5,-5.5) P12(3.5,-5.5) P13(4.5,-5.5) P14(5.5,-5.5) P15(6.5,-5.5) P16(7.5,-5.5) R1(-7.5,-6.5) R2(-6.5,-6.5) R3(-5.5,-6.5) R4(-4.5,-6.5) R5(-3.5,-6.5) R6(-2.5,-6.5) R7(-1.5,-6.5) R8(-0.5,-6.5) R9(0.5,-6.5) R10(1.5,-6.5) R11(2.5,-6.5) R12(3.5,-6.5) R13(4.5,-6.5) R14(5.5,-6.5) R15(6.5,-6.5) R16(7.5,-6.5) T1(-7.5,-7.5) T2(-6.5,-7.5) T3(-5.5,-7.5) T4(-4.5,-7.5) T5(-3.5,-7.5) T6(-2.5,-7.5) T7(-1.5,-7.5) T8(-0.5,-7.5) T9(0.5,-7.5) T10(1.5,-7.5) T11(2.5,-7.5) T12(3.5,-7.5) T13(4.5,-7.5) T14(5.5,-7.5) T15(6.5,-7.5) T16(7.5,-7.5)
Top Overlay:
  lines w0.203: -8.498,7.6 -8.498,8.498 -7.6,8.498 ; -8.498,7.6 -8.498,-8.498 8.498,-8.498 8.498,8.498 -7.6,8.498 ; -8.498,7.6 -7.6,8.498
Top Solder:
  drawing of 256 lines, arcs and shapes, not listed